# Altium schematic symbol library TI Power Management Shunt Voltage Reference.SchLib: 1526 symbols (part 13 of 18)
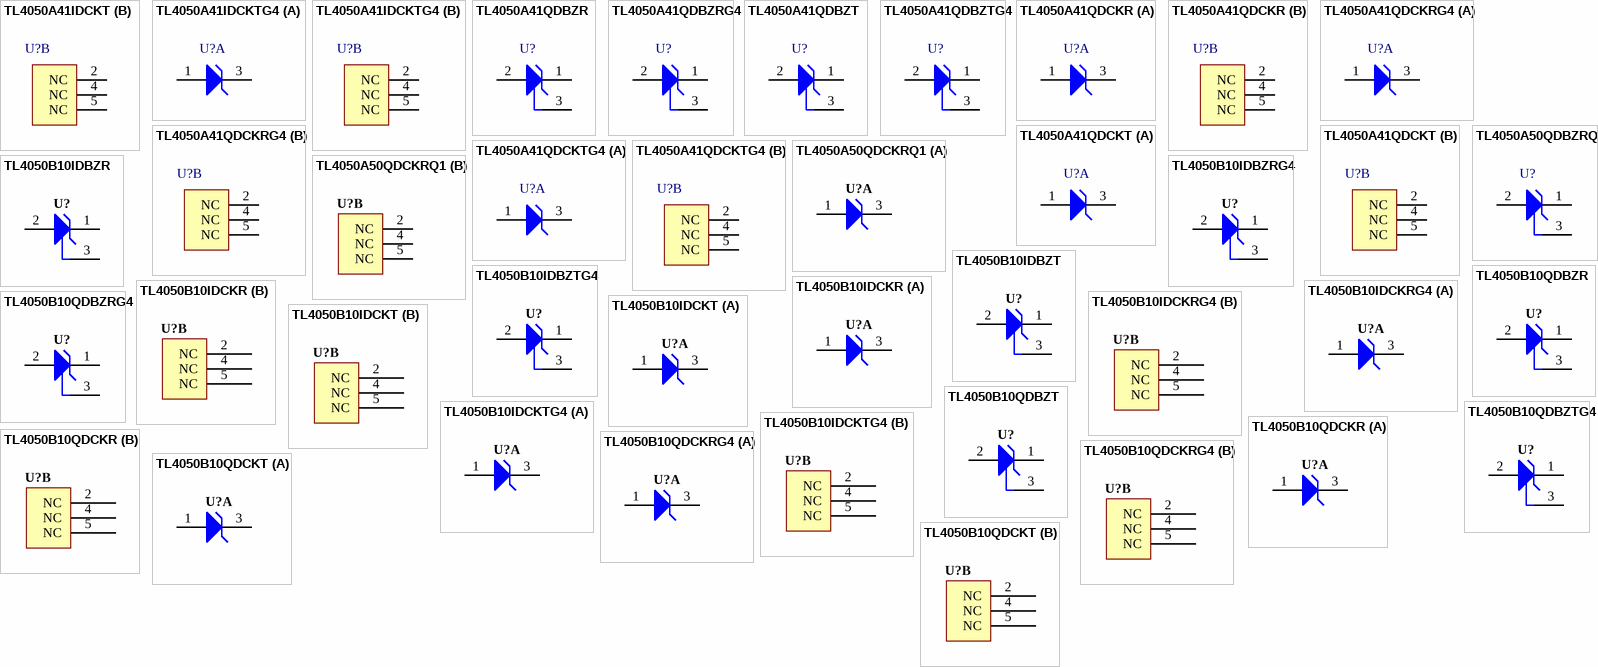
[diagram p69: symbols TL4050A41IDCKT to TL4050B10QDCKT]

## TL4050A41QDCKTG4
designator U?
Precision Micropower Shunt Voltage Reference, -40 to 125 degC, 5-pin SC70 (DCK), Green (RoHS & no Sb/Br); Manufacturer: Texas Instruments; PartNumber: TL4050A41QDCKTG4; Initial Accuracy @ 25/deg C(%): 0.1; Rating: Catalog; VO(V): 4.096; DatasheetVersion: SLOS486A; PackageReference: DCK5; PackageDescription: 5-Pin Plastic Small-Outline Package, 2 x 1.3 mm Body, 0.65 mm Pitch, 2.1 mm Lead Span; Supplier 1: Digi-Key; Supplier Part Number 1: TL4050A41QDCKTG4-ND; Supplier 2: Mouser; Supplier Part Number 2: 595-TL4050A41QDCKTG4; Eco-Plan: Green (RoHS & no Sb/Br); SubFamily: Shunt Voltage Reference; Mounting Technology: Surface Mount; Code_JEDEC: MO-203; ComponentLink1Description: Manufacturer URL; ComponentLink1URL: http://www.ti.com/; ComponentLink2Description: Datasheet; ComponentLink2URL: http://www.ti.com/general/docs/lit/getliterature.tsp?genericPartNumber=TL4050A41&fileType=pdf; ComponentLink3Description: Package Specification; ComponentLink3URL: http://www.ti.com/litv/pdf/mpds025f
footprint TI-DCK5_N (SOT353, 5-Leads, Body 2x1.3mm, Pitch 0.65mm, Lead Span 2.1mm, IPC Medium Density)
part A pins: 1 ANODE, 3 CATHODE
part B pins: 2 NC, 4 NC "NO internal connection", 5 NC "Pin 2 is attached to Substrate and must be connected to ANODE or left open."

## TL4050A50QDBZRQ1
designator U?
Automotive Catalog Precision Micropower Shunt Voltage Reference, 10 mA, -40 to 125 degC, 3-pin SOT-23 (DBZ), Green (RoHS & no Sb/Br); Manufacturer: Texas Instruments; PartNumber: TL4050A50QDBZRQ1; Initial Accuracy @ 25/deg C(%): 0.1; Iout/Iz(Max)(mA): 10; VO(V): 5; DatasheetVersion: SLOS588E; PackageVersion: 4203227/B; PackageReference: DBZ3; PackageDescription: 3-Pin Plastic Small Outline, Body 2.92 x 1.3 mm, Pitch 0.95 mm; Supplier 1: Digi-Key; Supplier Part Number 1: 296-27661-2-ND; Supplier 2: Digi-Key; Supplier Part Number 2: 296-27661-1-ND; Supplier 3: Digi-Key; Supplier Part Number 3: 296-27661-6-ND; Supplier 4: Newark; Supplier Part Number 4: 74R6605; Supplier 5: Mouser; Supplier Part Number 5: 595-TL4050A50QDBZRQ1; Eco-Plan: Green (RoHS & no Sb/Br); Rating: Automotive; SubFamily: Shunt Voltage Reference; Mounting Technology: Surface Mount; Code_JEDEC: TO-236; ComponentLink1Description: Manufacturer URL; ComponentLink1URL: http://www.ti.com/; ComponentLink2Description: Datasheet; ComponentLink2URL: http://www.ti.com/general/docs/lit/getliterature.tsp?genericPartNumber=TL4050A50-Q1&fileType=pdf; ComponentLink3Description: Package Specification; ComponentLink3URL: http://www.ti.com/litv/pdf/mpds108a
footprint TI-DBZ3_N (SOT23, 3-Leads, Body 2.92x1.3 mm, Pitch 0.95 mm, IPC Medium Density)
pins: 1 CATHODE, 2 ANODE, 3 NC

## TL4050A50QDCKRQ1
designator U?
Automotive Catalog Precision Micropower Shunt Voltage Reference, 10 mA, -40 to 125 degC, 5-pin SC70 (DCK), Green (RoHS & no Sb/Br); Manufacturer: Texas Instruments; PartNumber: TL4050A50QDCKRQ1; Initial Accuracy @ 25/deg C(%): 0.1; Iout/Iz(Max)(mA): 10; VO(V): 5; DatasheetVersion: SLOS588E; PackageReference: DCK5; PackageDescription: 5-Pin Plastic Small-Outline Package, 2 x 1.3 mm Body, 0.65 mm Pitch, 2.1 mm Lead Span; Supplier 1: Digi-Key; Supplier Part Number 1: 296-27662-2-ND; Supplier 2: Digi-Key; Supplier Part Number 2: 296-27662-1-ND; Supplier 3: Digi-Key; Supplier Part Number 3: 296-27662-6-ND; Supplier 4: Newark; Supplier Part Number 4: 74R6606; Supplier 5: Mouser; Supplier Part Number 5: 595-TL4050A50QDCKRQ1; Eco-Plan: Green (RoHS & no Sb/Br); Rating: Automotive; SubFamily: Shunt Voltage Reference; Mounting Technology: Surface Mount; Code_JEDEC: MO-203; ComponentLink1Description: Manufacturer URL; ComponentLink1URL: http://www.ti.com/; ComponentLink2Description: Datasheet; ComponentLink2URL: http://www.ti.com/general/docs/lit/getliterature.tsp?genericPartNumber=TL4050A50-Q1&fileType=pdf; ComponentLink3Description: Package Specification; ComponentLink3URL: http://www.ti.com/litv/pdf/mpds025f
footprint TI-DCK5_N (SOT353, 5-Leads, Body 2x1.3mm, Pitch 0.65mm, Lead Span 2.1mm, IPC Medium Density)
part A pins: 1 ANODE, 3 CATHODE
part B pins: 2 NC, 4 NC, 5 NC

## TL4050B10IDBZR
designator U?
PPrecision Micropower Shunt Voltage Reference, 10 V, -40 to 85 degC, 3-pin SOT-23 (DBZ), Green (RoHS & no Sb/Br); Manufacturer: Texas Instruments; PartNumber: TL4050B10IDBZR; Initial Accuracy @ 25/deg C(%): 0.2; Rating: Catalog; VO(V): 10; DatasheetVersion: SLOS486A; PackageVersion: 4203227/B; PackageReference: DBZ3; PackageDescription: 3-Pin Plastic Small Outline, Body 2.92 x 1.3 mm, Pitch 0.95 mm; Supplier 1: Digi-Key; Supplier Part Number 1: 296-22795-2-ND; Supplier 2: Digi-Key; Supplier Part Number 2: 296-22795-1-ND; Supplier 3: Digi-Key; Supplier Part Number 3: 296-22795-6-ND; Supplier 4: Newark; Supplier Part Number 4: 41M5685; Supplier 5: Mouser; Supplier Part Number 5: 595-TL4050B10IDBZR; Eco-Plan: Green (RoHS & no Sb/Br); SubFamily: Shunt Voltage Reference; Mounting Technology: Surface Mount; Code_JEDEC: TO-236; ComponentLink1Description: Manufacturer URL; ComponentLink1URL: http://www.ti.com/; ComponentLink2Description: Datasheet; ComponentLink2URL: http://www.ti.com/general/docs/lit/getliterature.tsp?genericPartNumber=TL4050B10&fileType=pdf; ComponentLink3Description: Package Specification; ComponentLink3URL: http://www.ti.com/litv/pdf/mpds108a
footprint TI-DBZ3_N (SOT23, 3-Leads, Body 2.92x1.3 mm, Pitch 0.95 mm, IPC Medium Density)
pins: 1 CATHODE, 2 ANODE, 3 NC

## TL4050B10IDBZRG4
designator U?
PPrecision Micropower Shunt Voltage Reference, 10 V, -40 to 85 degC, 3-pin SOT-23 (DBZ), Green (RoHS & no Sb/Br); Manufacturer: Texas Instruments; PartNumber: TL4050B10IDBZRG4; Initial Accuracy @ 25/deg C(%): 0.2; Rating: Catalog; VO(V): 10; DatasheetVersion: SLOS486A; PackageVersion: 4203227/B; PackageReference: DBZ3; PackageDescription: 3-Pin Plastic Small Outline, Body 2.92 x 1.3 mm, Pitch 0.95 mm; Supplier 1: Digi-Key; Supplier Part Number 1: TL4050B10IDBZRG4-ND; Supplier 2: Newark; Supplier Part Number 2: 46M0993; Supplier 3: Mouser; Supplier Part Number 3: 595-TL4050B10IDBZRG4; Eco-Plan: Green (RoHS & no Sb/Br); SubFamily: Shunt Voltage Reference; Mounting Technology: Surface Mount; Code_JEDEC: TO-236; ComponentLink1Description: Manufacturer URL; ComponentLink1URL: http://www.ti.com/; ComponentLink2Description: Datasheet; ComponentLink2URL: http://www.ti.com/general/docs/lit/getliterature.tsp?genericPartNumber=TL4050B10&fileType=pdf; ComponentLink3Description: Package Specification; ComponentLink3URL: http://www.ti.com/litv/pdf/mpds108a
footprint TI-DBZ3_N (SOT23, 3-Leads, Body 2.92x1.3 mm, Pitch 0.95 mm, IPC Medium Density)
pins: 1 CATHODE, 2 ANODE, 3 NC

## TL4050B10IDBZT
designator U?
PPrecision Micropower Shunt Voltage Reference, 10 V, -40 to 85 degC, 3-pin SOT-23 (DBZ), Green (RoHS & no Sb/Br); Manufacturer: Texas Instruments; PartNumber: TL4050B10IDBZT; Initial Accuracy @ 25/deg C(%): 0.2; Rating: Catalog; VO(V): 10; DatasheetVersion: SLOS486A; PackageVersion: 4203227/B; PackageReference: DBZ3; PackageDescription: 3-Pin Plastic Small Outline, Body 2.92 x 1.3 mm, Pitch 0.95 mm; Supplier 1: Digi-Key; Supplier Part Number 1: 296-32348-2-ND; Supplier 2: Digi-Key; Supplier Part Number 2: 296-32348-1-ND; Supplier 3: Digi-Key; Supplier Part Number 3: 296-32348-6-ND; Supplier 4: Farnell; Supplier Part Number 4: 1755352; Supplier 5: Mouser; Supplier Part Number 5: 595-TL4050B10IDBZT; Eco-Plan: Green (RoHS & no Sb/Br); SubFamily: Shunt Voltage Reference; Mounting Technology: Surface Mount; Code_JEDEC: TO-236; ComponentLink1Description: Manufacturer URL; ComponentLink1URL: http://www.ti.com/; ComponentLink2Description: Datasheet; ComponentLink2URL: http://www.ti.com/general/docs/lit/getliterature.tsp?genericPartNumber=TL4050B10&fileType=pdf; ComponentLink3Description: Package Specification; ComponentLink3URL: http://www.ti.com/litv/pdf/mpds108a
footprint TI-DBZ3_N (SOT23, 3-Leads, Body 2.92x1.3 mm, Pitch 0.95 mm, IPC Medium Density)
pins: 1 CATHODE, 2 ANODE, 3 NC

## TL4050B10IDBZTG4
designator U?
PPrecision Micropower Shunt Voltage Reference, 10 V, -40 to 85 degC, 3-pin SOT-23 (DBZ), Green (RoHS & no Sb/Br); Manufacturer: Texas Instruments; PartNumber: TL4050B10IDBZTG4; Initial Accuracy @ 25/deg C(%): 0.2; Rating: Catalog; VO(V): 10; DatasheetVersion: SLOS486A; PackageVersion: 4203227/B; PackageReference: DBZ3; PackageDescription: 3-Pin Plastic Small Outline, Body 2.92 x 1.3 mm, Pitch 0.95 mm; Supplier 1: Digi-Key; Supplier Part Number 1: TL4050B10IDBZTG4-ND; Supplier 2: Mouser; Supplier Part Number 2: 595-TL4050B10IDBZTG4; Eco-Plan: Green (RoHS & no Sb/Br); SubFamily: Shunt Voltage Reference; Mounting Technology: Surface Mount; Code_JEDEC: TO-236; ComponentLink1Description: Manufacturer URL; ComponentLink1URL: http://www.ti.com/; ComponentLink2Description: Datasheet; ComponentLink2URL: http://www.ti.com/general/docs/lit/getliterature.tsp?genericPartNumber=TL4050B10&fileType=pdf; ComponentLink3Description: Package Specification; ComponentLink3URL: http://www.ti.com/litv/pdf/mpds108a
footprint TI-DBZ3_N (SOT23, 3-Leads, Body 2.92x1.3 mm, Pitch 0.95 mm, IPC Medium Density)
pins: 1 CATHODE, 2 ANODE, 3 NC

## TL4050B10IDCKR
designator U?
PPrecision Micropower Shunt Voltage Reference, 10 V, -40 to 85 degC, 5-pin SC70 (DCK), Green (RoHS & no Sb/Br); Manufacturer: Texas Instruments; PartNumber: TL4050B10IDCKR; Initial Accuracy @ 25/deg C(%): 0.2; Rating: Catalog; VO(V): 10; DatasheetVersion: SLOS486A; PackageReference: DCK5; PackageDescription: 5-Pin Plastic Small-Outline Package, 2 x 1.3 mm Body, 0.65 mm Pitch, 2.1 mm Lead Span; Supplier 1: Digi-Key; Supplier Part Number 1: 296-22796-2-ND; Supplier 2: Digi-Key; Supplier Part Number 2: 296-22796-1-ND; Supplier 3: Digi-Key; Supplier Part Number 3: 296-22796-6-ND; Supplier 4: Newark; Supplier Part Number 4: 41M5687; Supplier 5: Mouser; Supplier Part Number 5: 595-TL4050B10IDCKR; Eco-Plan: Green (RoHS & no Sb/Br); SubFamily: Shunt Voltage Reference; Mounting Technology: Surface Mount; Code_JEDEC: MO-203; ComponentLink1Description: Manufacturer URL; ComponentLink1URL: http://www.ti.com/; ComponentLink2Description: Datasheet; ComponentLink2URL: http://www.ti.com/general/docs/lit/getliterature.tsp?genericPartNumber=TL4050B10&fileType=pdf; ComponentLink3Description: Package Specification; ComponentLink3URL: http://www.ti.com/litv/pdf/mpds025f
footprint TI-DCK5_N (SOT353, 5-Leads, Body 2x1.3mm, Pitch 0.65mm, Lead Span 2.1mm, IPC Medium Density)
part A pins: 1 ANODE, 3 CATHODE
part B pins: 2 NC, 4 NC, 5 NC

## TL4050B10IDCKRG4
designator U?
PPrecision Micropower Shunt Voltage Reference, 10 V, -40 to 85 degC, 5-pin SC70 (DCK), Green (RoHS & no Sb/Br); Manufacturer: Texas Instruments; PartNumber: TL4050B10IDCKRG4; Initial Accuracy @ 25/deg C(%): 0.2; Rating: Catalog; VO(V): 10; DatasheetVersion: SLOS486A; PackageReference: DCK5; PackageDescription: 5-Pin Plastic Small-Outline Package, 2 x 1.3 mm Body, 0.65 mm Pitch, 2.1 mm Lead Span; Supplier 1: Digi-Key; Supplier Part Number 1: TL4050B10IDCKRG4-ND; Supplier 2: Newark; Supplier Part Number 2: 46M9156; Supplier 3: Mouser; Supplier Part Number 3: 595-TL4050B10IDCKRG4; Eco-Plan: Green (RoHS & no Sb/Br); SubFamily: Shunt Voltage Reference; Mounting Technology: Surface Mount; Code_JEDEC: MO-203; ComponentLink1Description: Manufacturer URL; ComponentLink1URL: http://www.ti.com/; ComponentLink2Description: Datasheet; ComponentLink2URL: http://www.ti.com/general/docs/lit/getliterature.tsp?genericPartNumber=TL4050B10&fileType=pdf; ComponentLink3Description: Package Specification; ComponentLink3URL: http://www.ti.com/litv/pdf/mpds025f
footprint TI-DCK5_N (SOT353, 5-Leads, Body 2x1.3mm, Pitch 0.65mm, Lead Span 2.1mm, IPC Medium Density)
part A pins: 1 ANODE, 3 CATHODE
part B pins: 2 NC, 4 NC, 5 NC

## TL4050B10IDCKT
designator U?
PPrecision Micropower Shunt Voltage Reference, 10 V, -40 to 85 degC, 5-pin SC70 (DCK), Green (RoHS & no Sb/Br); Manufacturer: Texas Instruments; PartNumber: TL4050B10IDCKT; Initial Accuracy @ 25/deg C(%): 0.2; Rating: Catalog; VO(V): 10; DatasheetVersion: SLOS486A; PackageReference: DCK5; PackageDescription: 5-Pin Plastic Small-Outline Package, 2 x 1.3 mm Body, 0.65 mm Pitch, 2.1 mm Lead Span; Supplier 1: Digi-Key; Supplier Part Number 1: TL4050B10IDCKT-ND; Supplier 2: Mouser; Supplier Part Number 2: 595-TL4050B10IDCKT; Eco-Plan: Green (RoHS & no Sb/Br); SubFamily: Shunt Voltage Reference; Mounting Technology: Surface Mount; Code_JEDEC: MO-203; ComponentLink1Description: Manufacturer URL; ComponentLink1URL: http://www.ti.com/; ComponentLink2Description: Datasheet; ComponentLink2URL: http://www.ti.com/general/docs/lit/getliterature.tsp?genericPartNumber=TL4050B10&fileType=pdf; ComponentLink3Description: Package Specification; ComponentLink3URL: http://www.ti.com/litv/pdf/mpds025f
footprint TI-DCK5_N (SOT353, 5-Leads, Body 2x1.3mm, Pitch 0.65mm, Lead Span 2.1mm, IPC Medium Density)
part A pins: 1 ANODE, 3 CATHODE
part B pins: 2 NC, 4 NC, 5 NC

## TL4050B10IDCKTG4
designator U?
PPrecision Micropower Shunt Voltage Reference, 10 V, -40 to 85 degC, 5-pin SC70 (DCK), Green (RoHS & no Sb/Br); Manufacturer: Texas Instruments; PartNumber: TL4050B10IDCKTG4; Initial Accuracy @ 25/deg C(%): 0.2; Rating: Catalog; VO(V): 10; DatasheetVersion: SLOS486A; PackageReference: DCK5; PackageDescription: 5-Pin Plastic Small-Outline Package, 2 x 1.3 mm Body, 0.65 mm Pitch, 2.1 mm Lead Span; Supplier 1: Digi-Key; Supplier Part Number 1: TL4050B10IDCKTG4-ND; Supplier 2: Mouser; Supplier Part Number 2: 595-TL4050B10IDCKTG4; Eco-Plan: Green (RoHS & no Sb/Br); SubFamily: Shunt Voltage Reference; Mounting Technology: Surface Mount; Code_JEDEC: MO-203; ComponentLink1Description: Manufacturer URL; ComponentLink1URL: http://www.ti.com/; ComponentLink2Description: Datasheet; ComponentLink2URL: http://www.ti.com/general/docs/lit/getliterature.tsp?genericPartNumber=TL4050B10&fileType=pdf; ComponentLink3Description: Package Specification; ComponentLink3URL: http://www.ti.com/litv/pdf/mpds025f
footprint TI-DCK5_N (SOT353, 5-Leads, Body 2x1.3mm, Pitch 0.65mm, Lead Span 2.1mm, IPC Medium Density)
part A pins: 1 ANODE, 3 CATHODE
part B pins: 2 NC, 4 NC, 5 NC

## TL4050B10QDBZR
designator U?
Precision Micropower Shunt Voltage Reference, 10 V, -40 to 125 degC, 3-pin SOT-23 (DBZ), Green (RoHS & no Sb/Br); Manufacturer: Texas Instruments; PartNumber: TL4050B10QDBZR; Initial Accuracy @ 25/deg C(%): 0.2; Rating: Catalog; VO(V): 10; DatasheetVersion: SLOS486A; PackageVersion: 4203227/B; PackageReference: DBZ3; PackageDescription: 3-Pin Plastic Small Outline, Body 2.92 x 1.3 mm, Pitch 0.95 mm; Supplier 1: Digi-Key; Supplier Part Number 1: 296-22797-2-ND; Supplier 2: Digi-Key; Supplier Part Number 2: 296-22797-1-ND; Supplier 3: Digi-Key; Supplier Part Number 3: 296-22797-6-ND; Supplier 4: Newark; Supplier Part Number 4: 41M5689; Supplier 5: Mouser; Supplier Part Number 5: 595-TL4050B10QDBZR; Eco-Plan: Green (RoHS & no Sb/Br); SubFamily: Shunt Voltage Reference; Mounting Technology: Surface Mount; Code_JEDEC: TO-236; ComponentLink1Description: Manufacturer URL; ComponentLink1URL: http://www.ti.com/; ComponentLink2Description: Datasheet; ComponentLink2URL: http://www.ti.com/general/docs/lit/getliterature.tsp?genericPartNumber=TL4050B10&fileType=pdf; ComponentLink3Description: Package Specification; ComponentLink3URL: http://www.ti.com/litv/pdf/mpds108a
footprint TI-DBZ3_N (SOT23, 3-Leads, Body 2.92x1.3 mm, Pitch 0.95 mm, IPC Medium Density)
pins: 1 CATHODE, 2 ANODE, 3 NC

## TL4050B10QDBZRG4
designator U?
Precision Micropower Shunt Voltage Reference, 10 V, -40 to 125 degC, 3-pin SOT-23 (DBZ), Green (RoHS & no Sb/Br); Manufacturer: Texas Instruments; PartNumber: TL4050B10QDBZRG4; Initial Accuracy @ 25/deg C(%): 0.2; Rating: Catalog; VO(V): 10; DatasheetVersion: SLOS486A; PackageVersion: 4203227/B; PackageReference: DBZ3; PackageDescription: 3-Pin Plastic Small Outline, Body 2.92 x 1.3 mm, Pitch 0.95 mm; Supplier 1: Digi-Key; Supplier Part Number 1: TL4050B10QDBZRG4-ND; Supplier 2: Newark; Supplier Part Number 2: 46M0995; Supplier 3: Mouser; Supplier Part Number 3: 595-TL4050B10QDBZRG4; Eco-Plan: Green (RoHS & no Sb/Br); SubFamily: Shunt Voltage Reference; Mounting Technology: Surface Mount; Code_JEDEC: TO-236; ComponentLink1Description: Manufacturer URL; ComponentLink1URL: http://www.ti.com/; ComponentLink2Description: Datasheet; ComponentLink2URL: http://www.ti.com/general/docs/lit/getliterature.tsp?genericPartNumber=TL4050B10&fileType=pdf; ComponentLink3Description: Package Specification; ComponentLink3URL: http://www.ti.com/litv/pdf/mpds108a
footprint TI-DBZ3_N (SOT23, 3-Leads, Body 2.92x1.3 mm, Pitch 0.95 mm, IPC Medium Density)
pins: 1 CATHODE, 2 ANODE, 3 NC

## TL4050B10QDBZT
designator U?
Precision Micropower Shunt Voltage Reference, 10 V, -40 to 125 degC, 3-pin SOT-23 (DBZ), Green (RoHS & no Sb/Br); Manufacturer: Texas Instruments; PartNumber: TL4050B10QDBZT; Initial Accuracy @ 25/deg C(%): 0.2; Rating: Catalog; VO(V): 10; DatasheetVersion: SLOS486A; PackageVersion: 4203227/B; PackageReference: DBZ3; PackageDescription: 3-Pin Plastic Small Outline, Body 2.92 x 1.3 mm, Pitch 0.95 mm; Supplier 1: Digi-Key; Supplier Part Number 1: 296-32349-2-ND; Supplier 2: Digi-Key; Supplier Part Number 2: 296-32349-1-ND; Supplier 3: Digi-Key; Supplier Part Number 3: 296-32349-6-ND; Supplier 4: Mouser; Supplier Part Number 4: 595-TL4050B10QDBZT; Eco-Plan: Green (RoHS & no Sb/Br); SubFamily: Shunt Voltage Reference; Mounting Technology: Surface Mount; Code_JEDEC: TO-236; ComponentLink1Description: Manufacturer URL; ComponentLink1URL: http://www.ti.com/; ComponentLink2Description: Datasheet; ComponentLink2URL: http://www.ti.com/general/docs/lit/getliterature.tsp?genericPartNumber=TL4050B10&fileType=pdf; ComponentLink3Description: Package Specification; ComponentLink3URL: http://www.ti.com/litv/pdf/mpds108a
footprint TI-DBZ3_N (SOT23, 3-Leads, Body 2.92x1.3 mm, Pitch 0.95 mm, IPC Medium Density)
pins: 1 CATHODE, 2 ANODE, 3 NC

## TL4050B10QDBZTG4
designator U?
Precision Micropower Shunt Voltage Reference, 10 V, -40 to 125 degC, 3-pin SOT-23 (DBZ), Green (RoHS & no Sb/Br); Manufacturer: Texas Instruments; PartNumber: TL4050B10QDBZTG4; Initial Accuracy @ 25/deg C(%): 0.2; Rating: Catalog; VO(V): 10; DatasheetVersion: SLOS486A; PackageVersion: 4203227/B; PackageReference: DBZ3; PackageDescription: 3-Pin Plastic Small Outline, Body 2.92 x 1.3 mm, Pitch 0.95 mm; Supplier 1: Digi-Key; Supplier Part Number 1: TL4050B10QDBZTG4-ND; Supplier 2: Mouser; Supplier Part Number 2: 595-TL4050B10QDBZTG4; Eco-Plan: Green (RoHS & no Sb/Br); SubFamily: Shunt Voltage Reference; Mounting Technology: Surface Mount; Code_JEDEC: TO-236; ComponentLink1Description: Manufacturer URL; ComponentLink1URL: http://www.ti.com/; ComponentLink2Description: Datasheet; ComponentLink2URL: http://www.ti.com/general/docs/lit/getliterature.tsp?genericPartNumber=TL4050B10&fileType=pdf; ComponentLink3Description: Package Specification; ComponentLink3URL: http://www.ti.com/litv/pdf/mpds108a
footprint TI-DBZ3_N (SOT23, 3-Leads, Body 2.92x1.3 mm, Pitch 0.95 mm, IPC Medium Density)
pins: 1 CATHODE, 2 ANODE, 3 NC

## TL4050B10QDCKR
designator U?
Precision Micropower Shunt Voltage Reference, 10 V, -40 to 125 degC, 5-pin SC70 (DCK), Green (RoHS & no Sb/Br); Manufacturer: Texas Instruments; PartNumber: TL4050B10QDCKR; Initial Accuracy @ 25/deg C(%): 0.2; Rating: Catalog; VO(V): 10; DatasheetVersion: SLOS486A; PackageReference: DCK5; PackageDescription: 5-Pin Plastic Small-Outline Package, 2 x 1.3 mm Body, 0.65 mm Pitch, 2.1 mm Lead Span; Supplier 1: Digi-Key; Supplier Part Number 1: 296-22798-2-ND; Supplier 2: Digi-Key; Supplier Part Number 2: 296-22798-1-ND; Supplier 3: Digi-Key; Supplier Part Number 3: 296-22798-6-ND; Supplier 4: Newark; Supplier Part Number 4: 41M5691; Supplier 5: Mouser; Supplier Part Number 5: 595-TL4050B10QDCKR; Eco-Plan: Green (RoHS & no Sb/Br); SubFamily: Shunt Voltage Reference; Mounting Technology: Surface Mount; Code_JEDEC: MO-203; ComponentLink1Description: Manufacturer URL; ComponentLink1URL: http://www.ti.com/; ComponentLink2Description: Datasheet; ComponentLink2URL: http://www.ti.com/general/docs/lit/getliterature.tsp?genericPartNumber=TL4050B10&fileType=pdf; ComponentLink3Description: Package Specification; ComponentLink3URL: http://www.ti.com/litv/pdf/mpds025f
footprint TI-DCK5_N (SOT353, 5-Leads, Body 2x1.3mm, Pitch 0.65mm, Lead Span 2.1mm, IPC Medium Density)
part A pins: 1 ANODE, 3 CATHODE
part B pins: 2 NC, 4 NC, 5 NC

## TL4050B10QDCKRG4
designator U?
Precision Micropower Shunt Voltage Reference, 10 V, -40 to 125 degC, 5-pin SC70 (DCK), Green (RoHS & no Sb/Br); Manufacturer: Texas Instruments; PartNumber: TL4050B10QDCKRG4; Initial Accuracy @ 25/deg C(%): 0.2; Rating: Catalog; VO(V): 10; DatasheetVersion: SLOS486A; PackageReference: DCK5; PackageDescription: 5-Pin Plastic Small-Outline Package, 2 x 1.3 mm Body, 0.65 mm Pitch, 2.1 mm Lead Span; Supplier 1: Digi-Key; Supplier Part Number 1: TL4050B10QDCKRG4-ND; Supplier 2: Newark; Supplier Part Number 2: 46M9158; Supplier 3: Mouser; Supplier Part Number 3: 595-TL4050B10QDCKRG4; Eco-Plan: Green (RoHS & no Sb/Br); SubFamily: Shunt Voltage Reference; Mounting Technology: Surface Mount; Code_JEDEC: MO-203; ComponentLink1Description: Manufacturer URL; ComponentLink1URL: http://www.ti.com/; ComponentLink2Description: Datasheet; ComponentLink2URL: http://www.ti.com/general/docs/lit/getliterature.tsp?genericPartNumber=TL4050B10&fileType=pdf; ComponentLink3Description: Package Specification; ComponentLink3URL: http://www.ti.com/litv/pdf/mpds025f
footprint TI-DCK5_N (SOT353, 5-Leads, Body 2x1.3mm, Pitch 0.65mm, Lead Span 2.1mm, IPC Medium Density)
part A pins: 1 ANODE, 3 CATHODE
part B pins: 2 NC, 4 NC, 5 NC

## TL4050B10QDCKT
designator U?
Precision Micropower Shunt Voltage Reference, 10 V, -40 to 125 degC, 5-pin SC70 (DCK), Green (RoHS & no Sb/Br); Manufacturer: Texas Instruments; PartNumber: TL4050B10QDCKT; Initial Accuracy @ 25/deg C(%): 0.2; Rating: Catalog; VO(V): 10; DatasheetVersion: SLOS486A; PackageReference: DCK5; PackageDescription: 5-Pin Plastic Small-Outline Package, 2 x 1.3 mm Body, 0.65 mm Pitch, 2.1 mm Lead Span; Supplier 1: Digi-Key; Supplier Part Number 1: TL4050B10QDCKT-ND; Supplier 2: Mouser; Supplier Part Number 2: 595-TL4050B10QDCKT; Eco-Plan: Green (RoHS & no Sb/Br); SubFamily: Shunt Voltage Reference; Mounting Technology: Surface Mount; Code_JEDEC: MO-203; ComponentLink1Description: Manufacturer URL; ComponentLink1URL: http://www.ti.com/; ComponentLink2Description: Datasheet; ComponentLink2URL: http://www.ti.com/general/docs/lit/getliterature.tsp?genericPartNumber=TL4050B10&fileType=pdf; ComponentLink3Description: Package Specification; ComponentLink3URL: http://www.ti.com/litv/pdf/mpds025f
footprint TI-DCK5_N (SOT353, 5-Leads, Body 2x1.3mm, Pitch 0.65mm, Lead Span 2.1mm, IPC Medium Density)
part A pins: 1 ANODE, 3 CATHODE
part B pins: 2 NC, 4 NC, 5 NC

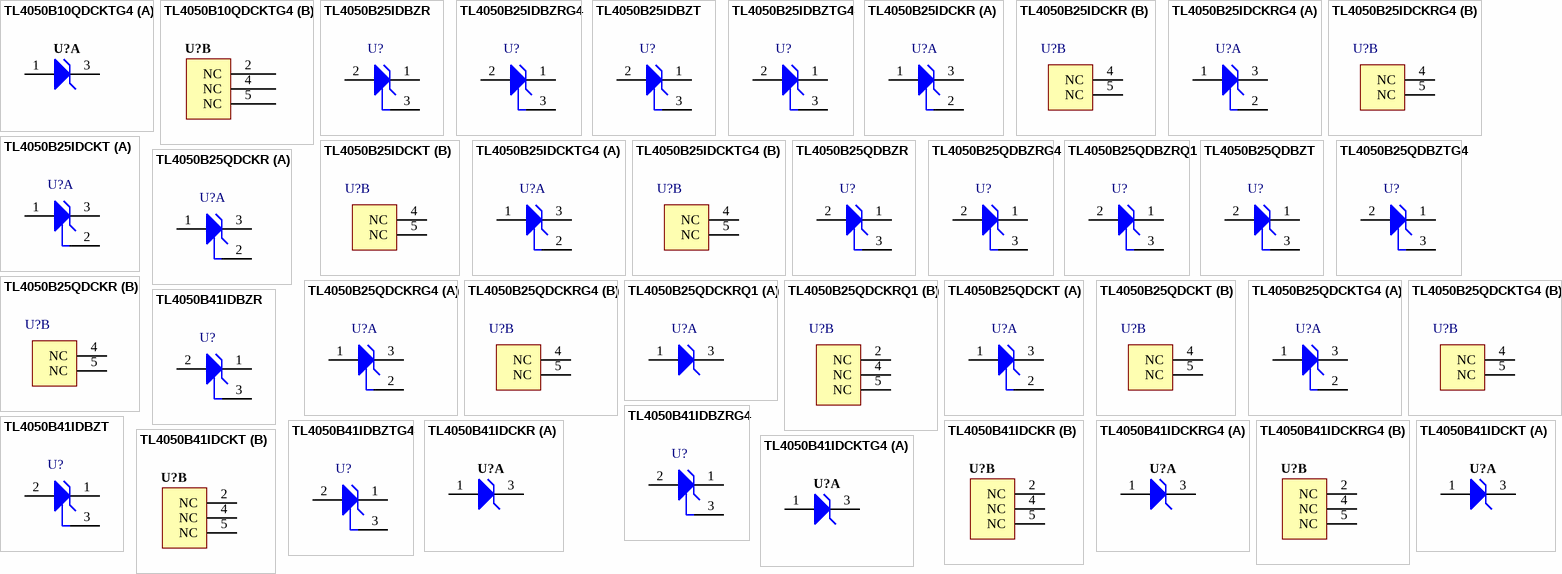
[diagram p39: symbols TL4050B10QDCKTG4 to TL4050B41IDCKTG4]

## TL4050B10QDCKTG4
designator U?
Precision Micropower Shunt Voltage Reference, 10 V, -40 to 125 degC, 5-pin SC70 (DCK), Green (RoHS & no Sb/Br); Manufacturer: Texas Instruments; PartNumber: TL4050B10QDCKTG4; Initial Accuracy @ 25/deg C(%): 0.2; Rating: Catalog; VO(V): 10; DatasheetVersion: SLOS486A; PackageReference: DCK5; PackageDescription: 5-Pin Plastic Small-Outline Package, 2 x 1.3 mm Body, 0.65 mm Pitch, 2.1 mm Lead Span; Supplier 1: Digi-Key; Supplier Part Number 1: TL4050B10QDCKTG4-ND; Supplier 2: Mouser; Supplier Part Number 2: 595-TL4050B10QDCKTG4; Eco-Plan: Green (RoHS & no Sb/Br); SubFamily: Shunt Voltage Reference; Mounting Technology: Surface Mount; Code_JEDEC: MO-203; ComponentLink1Description: Manufacturer URL; ComponentLink1URL: http://www.ti.com/; ComponentLink2Description: Datasheet; ComponentLink2URL: http://www.ti.com/general/docs/lit/getliterature.tsp?genericPartNumber=TL4050B10&fileType=pdf; ComponentLink3Description: Package Specification; ComponentLink3URL: http://www.ti.com/litv/pdf/mpds025f
footprint TI-DCK5_N (SOT353, 5-Leads, Body 2x1.3mm, Pitch 0.65mm, Lead Span 2.1mm, IPC Medium Density)
part A pins: 1 ANODE, 3 CATHODE
part B pins: 2 NC, 4 NC, 5 NC

## TL4050B25IDBZR
designator U?
Precision Micropower Shunt Voltage Reference, 2.5 V, -40 to 85 degC, 3-pin SOT-23 (DBZ), Green (RoHS & no Sb/Br); Manufacturer: Texas Instruments; PartNumber: TL4050B25IDBZR; Initial Accuracy @ 25/deg C(%): 0.2; Rating: Catalog; VO(V): 2.5; DatasheetVersion: SLOS486A; PackageVersion: 4203227/B; PackageReference: DBZ3; PackageDescription: 3-Pin Plastic Small Outline, Body 2.92 x 1.3 mm, Pitch 0.95 mm; Supplier 1: Digi-Key; Supplier Part Number 1: 296-22799-2-ND; Supplier 2: Digi-Key; Supplier Part Number 2: 296-22799-1-ND; Supplier 3: Digi-Key; Supplier Part Number 3: 296-22799-6-ND; Supplier 4: Newark; Supplier Part Number 4: 41M5693; Supplier 5: Mouser; Supplier Part Number 5: 595-TL4050B25IDBZR; Eco-Plan: Green (RoHS & no Sb/Br); SubFamily: Shunt Voltage Reference; Mounting Technology: Surface Mount; Code_JEDEC: TO-236; ComponentLink1Description: Manufacturer URL; ComponentLink1URL: http://www.ti.com/; ComponentLink2Description: Datasheet; ComponentLink2URL: http://www.ti.com/general/docs/lit/getliterature.tsp?genericPartNumber=TL4050B25&fileType=pdf; ComponentLink3Description: Package Specification; ComponentLink3URL: http://www.ti.com/litv/pdf/mpds108a; ComponentLink4Description: URL Link1; ComponentLink4URL: Samples URL:http://www.ti.com/general/docs/lit/getliterature.tsp?genericPartNumber=tl4050b41&fileType=pdf
footprint TI-DBZ3_N (SOT23, 3-Leads, Body 2.92x1.3 mm, Pitch 0.95 mm, IPC Medium Density)
pins: 1 CATHODE, 2 ANODE, 3 NC

## TL4050B25IDBZRG4
designator U?
Precision Micropower Shunt Voltage Reference, 2.5 V, -40 to 85 degC, 3-pin SOT-23 (DBZ), Green (RoHS & no Sb/Br); Manufacturer: Texas Instruments; PartNumber: TL4050B25IDBZRG4; Initial Accuracy @ 25/deg C(%): 0.2; Rating: Catalog; VO(V): 2.5; DatasheetVersion: SLOS486A; PackageVersion: 4203227/B; PackageReference: DBZ3; PackageDescription: 3-Pin Plastic Small Outline, Body 2.92 x 1.3 mm, Pitch 0.95 mm; Supplier 1: Digi-Key; Supplier Part Number 1: TL4050B25IDBZRG4-ND; Supplier 2: Newark; Supplier Part Number 2: 46M0997; Supplier 3: Mouser; Supplier Part Number 3: 595-TL4050B25IDBZRG4; Eco-Plan: Green (RoHS & no Sb/Br); SubFamily: Shunt Voltage Reference; Mounting Technology: Surface Mount; Code_JEDEC: TO-236; ComponentLink1Description: Manufacturer URL; ComponentLink1URL: http://www.ti.com/; ComponentLink2Description: Datasheet; ComponentLink2URL: http://www.ti.com/general/docs/lit/getliterature.tsp?genericPartNumber=TL4050B25&fileType=pdf; ComponentLink3Description: Package Specification; ComponentLink3URL: http://www.ti.com/litv/pdf/mpds108a; ComponentLink4Description: URL Link1; ComponentLink4URL: Samples URL:http://www.ti.com/general/docs/lit/getliterature.tsp?genericPartNumber=tl4050b41&fileType=pdf
footprint TI-DBZ3_N (SOT23, 3-Leads, Body 2.92x1.3 mm, Pitch 0.95 mm, IPC Medium Density)
pins: 1 CATHODE, 2 ANODE, 3 NC

## TL4050B25IDBZT
designator U?
Precision Micropower Shunt Voltage Reference, 2.5 V, -40 to 85 degC, 3-pin SOT-23 (DBZ), Green (RoHS & no Sb/Br); Manufacturer: Texas Instruments; PartNumber: TL4050B25IDBZT; Initial Accuracy @ 25/deg C(%): 0.2; Rating: Catalog; VO(V): 2.5; DatasheetVersion: SLOS486A; PackageVersion: 4203227/B; PackageReference: DBZ3; PackageDescription: 3-Pin Plastic Small Outline, Body 2.92 x 1.3 mm, Pitch 0.95 mm; Supplier 1: Digi-Key; Supplier Part Number 1: TL4050B25IDBZT-ND; Supplier 2: Farnell; Supplier Part Number 2: 1755354; Supplier 3: Newark; Supplier Part Number 3: 34R9126; Supplier 4: Mouser; Supplier Part Number 4: 595-TL4050B25IDBZT; Eco-Plan: Green (RoHS & no Sb/Br); SubFamily: Shunt Voltage Reference; Mounting Technology: Surface Mount; Code_JEDEC: TO-236; ComponentLink1Description: Manufacturer URL; ComponentLink1URL: http://www.ti.com/; ComponentLink2Description: Datasheet; ComponentLink2URL: http://www.ti.com/general/docs/lit/getliterature.tsp?genericPartNumber=TL4050B25&fileType=pdf; ComponentLink3Description: Package Specification; ComponentLink3URL: http://www.ti.com/litv/pdf/mpds108a; ComponentLink4Description: URL Link1; ComponentLink4URL: Samples URL:http://www.ti.com/general/docs/lit/getliterature.tsp?genericPartNumber=tl4050b41&fileType=pdf
footprint TI-DBZ3_N (SOT23, 3-Leads, Body 2.92x1.3 mm, Pitch 0.95 mm, IPC Medium Density)
pins: 1 CATHODE, 2 ANODE, 3 NC

## TL4050B25IDBZTG4
designator U?
Precision Micropower Shunt Voltage Reference, 2.5 V, -40 to 85 degC, 3-pin SOT-23 (DBZ), Green (RoHS & no Sb/Br); Manufacturer: Texas Instruments; PartNumber: TL4050B25IDBZTG4; Initial Accuracy @ 25/deg C(%): 0.2; Rating: Catalog; VO(V): 2.5; DatasheetVersion: SLOS486A; PackageVersion: 4203227/B; PackageReference: DBZ3; PackageDescription: 3-Pin Plastic Small Outline, Body 2.92 x 1.3 mm, Pitch 0.95 mm; Supplier 1: Digi-Key; Supplier Part Number 1: TL4050B25IDBZTG4-ND; Supplier 2: Mouser; Supplier Part Number 2: 595-TL4050B25IDBZTG4; Eco-Plan: Green (RoHS & no Sb/Br); SubFamily: Shunt Voltage Reference; Mounting Technology: Surface Mount; Code_JEDEC: TO-236; ComponentLink1Description: Manufacturer URL; ComponentLink1URL: http://www.ti.com/; ComponentLink2Description: Datasheet; ComponentLink2URL: http://www.ti.com/general/docs/lit/getliterature.tsp?genericPartNumber=TL4050B25&fileType=pdf; ComponentLink3Description: Package Specification; ComponentLink3URL: http://www.ti.com/litv/pdf/mpds108a
footprint TI-DBZ3_N (SOT23, 3-Leads, Body 2.92x1.3 mm, Pitch 0.95 mm, IPC Medium Density)
pins: 1 CATHODE, 2 ANODE, 3 NC

## TL4050B25IDCKR
designator U?
Precision Micropower Shunt Voltage Reference, 2.5 V, -40 to 125 degC, 5-pin SC70 (DCK), Green (RoHS & no Sb/Br); Manufacturer: Texas Instruments; PartNumber: TL4050B25IDCKR; Initial Accuracy @ 25/deg C(%): 0.2; Rating: Catalog; VO(V): 2.5; DatasheetVersion: SLOS486A; PackageReference: DCK5; PackageDescription: 5-Pin Plastic Small-Outline Package, 2 x 1.3 mm Body, 0.65 mm Pitch, 2.1 mm Lead Span; Supplier 1: Digi-Key; Supplier Part Number 1: 296-22800-2-ND; Supplier 2: Digi-Key; Supplier Part Number 2: 296-22800-1-ND; Supplier 3: Digi-Key; Supplier Part Number 3: 296-22800-6-ND; Supplier 4: Newark; Supplier Part Number 4: 41M5695; Supplier 5: Mouser; Supplier Part Number 5: 595-TL4050B25IDCKR; Eco-Plan: Green (RoHS & no Sb/Br); SubFamily: Shunt Voltage Reference; Mounting Technology: Surface Mount; Code_JEDEC: MO-203; ComponentLink1Description: Manufacturer URL; ComponentLink1URL: http://www.ti.com/; ComponentLink2Description: Datasheet; ComponentLink2URL: http://www.ti.com/general/docs/lit/getliterature.tsp?genericPartNumber=TL4050B25&fileType=pdf; ComponentLink3Description: Package Specification; ComponentLink3URL: http://www.ti.com/litv/pdf/mpds025f; ComponentLink4Description: URL Link1; ComponentLink4URL: Samples URL:http://www.ti.com/general/docs/lit/getliterature.tsp?genericPartNumber=tl4050b41&fileType=pdf
footprint TI-DCK5_N (SOT353, 5-Leads, Body 2x1.3mm, Pitch 0.65mm, Lead Span 2.1mm, IPC Medium Density)
part A pins: 1 ANODE, 2 NC, 3 CATHODE
part B pins: 4 NC, 5 NC

## TL4050B25IDCKRG4
designator U?
Precision Micropower Shunt Voltage Reference, 2.5 V, -40 to 125 degC, 5-pin SC70 (DCK), Green (RoHS & no Sb/Br); Manufacturer: Texas Instruments; PartNumber: TL4050B25IDCKRG4; Initial Accuracy @ 25/deg C(%): 0.2; Rating: Catalog; VO(V): 2.5; DatasheetVersion: SLOS486A; PackageReference: DCK5; PackageDescription: 5-Pin Plastic Small-Outline Package, 2 x 1.3 mm Body, 0.65 mm Pitch, 2.1 mm Lead Span; Supplier 1: Digi-Key; Supplier Part Number 1: TL4050B25IDCKRG4-ND; Supplier 2: Newark; Supplier Part Number 2: 46M9160; Supplier 3: Mouser; Supplier Part Number 3: 595-TL4050B25IDCKRG4; Eco-Plan: Green (RoHS & no Sb/Br); SubFamily: Shunt Voltage Reference; Mounting Technology: Surface Mount; Code_JEDEC: MO-203; ComponentLink1Description: Manufacturer URL; ComponentLink1URL: http://www.ti.com/; ComponentLink2Description: Datasheet; ComponentLink2URL: http://www.ti.com/general/docs/lit/getliterature.tsp?genericPartNumber=TL4050B25&fileType=pdf; ComponentLink3Description: Package Specification; ComponentLink3URL: http://www.ti.com/litv/pdf/mpds025f; ComponentLink4Description: URL Link1; ComponentLink4URL: Samples URL:http://www.ti.com/general/docs/lit/getliterature.tsp?genericPartNumber=tl4050b41&fileType=pdf
footprint TI-DCK5_N (SOT353, 5-Leads, Body 2x1.3mm, Pitch 0.65mm, Lead Span 2.1mm, IPC Medium Density)
part A pins: 1 ANODE, 2 NC, 3 CATHODE
part B pins: 4 NC, 5 NC

## TL4050B25IDCKT
designator U?
Precision Micropower Shunt Voltage Reference, 2.5 V, -40 to 125 degC, 5-pin SC70 (DCK), Green (RoHS & no Sb/Br); Manufacturer: Texas Instruments; PartNumber: TL4050B25IDCKT; Initial Accuracy @ 25/deg C(%): 0.2; Rating: Catalog; VO(V): 2.5; DatasheetVersion: SLOS486A; PackageReference: DCK5; PackageDescription: 5-Pin Plastic Small-Outline Package, 2 x 1.3 mm Body, 0.65 mm Pitch, 2.1 mm Lead Span; Supplier 1: Digi-Key; Supplier Part Number 1: TL4050B25IDCKT-ND; Supplier 2: Mouser; Supplier Part Number 2: 595-TL4050B25IDCKT; Eco-Plan: Green (RoHS & no Sb/Br); SubFamily: Shunt Voltage Reference; Mounting Technology: Surface Mount; Code_JEDEC: MO-203; ComponentLink1Description: Manufacturer URL; ComponentLink1URL: http://www.ti.com/; ComponentLink2Description: Datasheet; ComponentLink2URL: http://www.ti.com/general/docs/lit/getliterature.tsp?genericPartNumber=TL4050B25&fileType=pdf; ComponentLink3Description: Package Specification; ComponentLink3URL: http://www.ti.com/litv/pdf/mpds025f; ComponentLink4Description: URL Link1; ComponentLink4URL: Samples URL:http://www.ti.com/general/docs/lit/getliterature.tsp?genericPartNumber=tl4050b41&fileType=pdf
footprint TI-DCK5_N (SOT353, 5-Leads, Body 2x1.3mm, Pitch 0.65mm, Lead Span 2.1mm, IPC Medium Density)
part A pins: 1 ANODE, 2 NC, 3 CATHODE
part B pins: 4 NC, 5 NC
